# Altium footprint library TarabusLib_KAP.PcbLib: 504 footprints (part 24 of 32)
Each footprint in its own frame and in the unit in brackets; x right, y up, seen from the top. Pads: shape width x height; smd on the part's side, far side on the other; paste and mask are expansions set on the pad; w line width, h text height; cw(c..) or ccw(c..) is an arc to the next point about the centre after c.
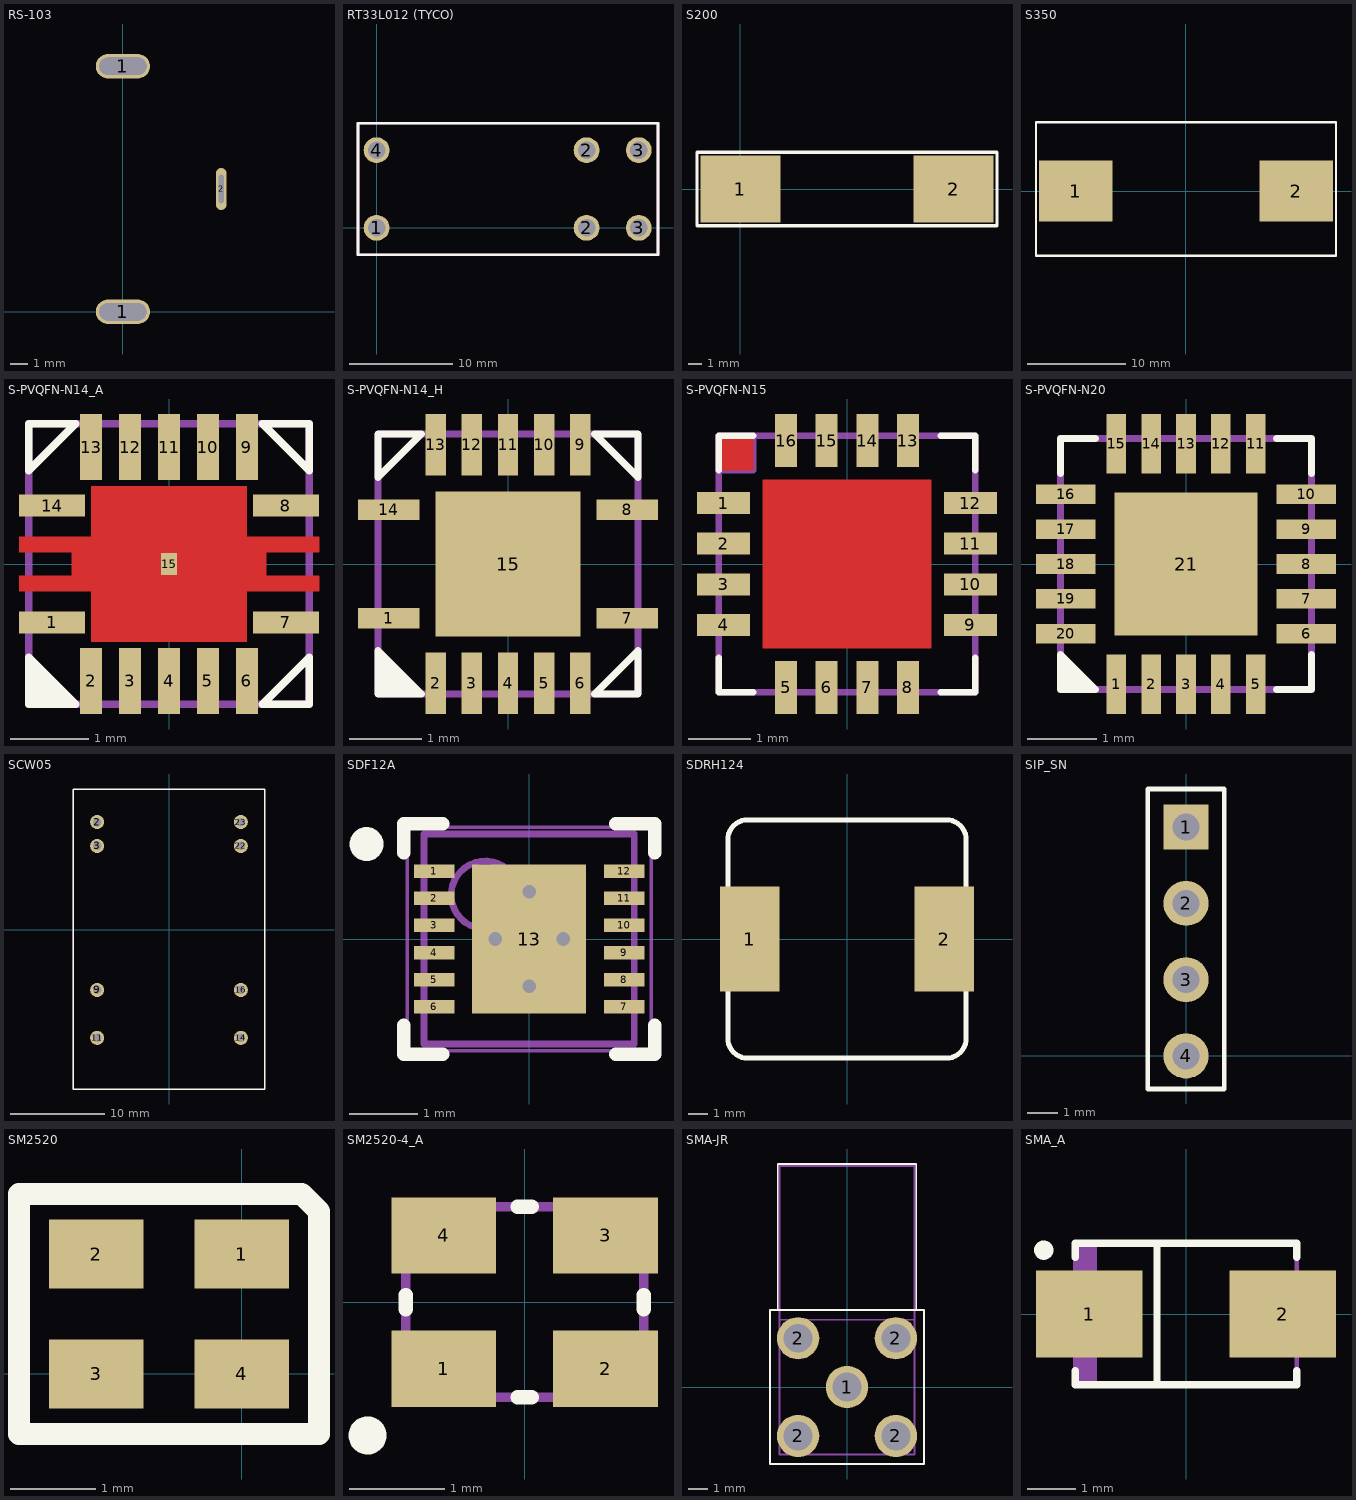
[diagram p23: the footprints below, top view; thin cyan lines are the x and y axes]

## RS-103 [mm]
pads (3):
  oval 3.1x1.4 hole 1 slot 2.7 at 0 deg: 1(0,0) 1(0,14)
  oval 0.6x2.4 hole 0.3 slot 1.6 at 90 deg: 2(5.6,7)
3D body: height 14.4, standoff 0, extent -17.45,-0.35 5.9,14.35

## RT33L012 (TYCO) [mm]
pads (6):
  round 2.5 hole 1.7 mask+0: 1(0,0) 2(20.3,0) 2(20.3,7.5) 3(25.34,0) 3(25.34,7.5) 4(0,7.5)
Top Overlay:
  lines w0.254: -1.8,-2.6 -1.8,10.1 27.2,10.1 27.2,-2.6 -1.8,-2.6
Mechanical 7:
  lines w0.254: -1.8,-2.6 27.2,-2.6 27.2,10.1 -1.8,10.1 -1.8,-2.6
3D body: height 15.7, standoff 0, extent -1.8,-2.6 27.2,10.1

## S200 [mm]
pads (2):
  rect 6x5 smd: 1(0,0) 2(16,0)
Top Overlay:
  lines w0.254: -3.25,-2.75 -3.25,2.75 19.25,2.75 19.25,-2.75 -3.25,-2.75
3D body "S200.STEP": height 0.85, standoff 0.05, extent -2.177,-2.54 17.823,2.46

## S350 [mm]
pads (2):
  rect 7.5x6.2 smd: 1(-11.25,0) 2(11.25,0)
Top Overlay:
  lines w0.254: -15.3,7.05 -15.3,6.7 -15.3,-6.625 15.325,-6.625 15.325,6.85 ; -15.25,7.05 15.025,7.05 15.325,7.05 15.325,6.35
3D body "S350.STEP": height 0.7, standoff -0.1, extent -14.975,-6.375 15.025,6.625

## S-PVQFN-N14_A [mm]
height 1
pads (15):
  rect 0.85x0.28 smd mask+0: 1(-1.5,-0.75) 7(1.5,-0.75) 8(1.5,0.75) 14(-1.5,0.75)
  rect 0.28x0.85 smd mask+0: 2(-1,-1.5) 3(-0.5,-1.5) 4(0,-1.5) 5(0.5,-1.5) 6(1,-1.5) 9(1,1.5) 10(0.5,1.5) 11(0,1.5) 12(-0.5,1.5) 13(-1,1.5)
  rect 0.2x0.28 smd mask+0: 15(0,0)
Top Layer:
  region: 1,-1 1,-0.35 1.925,-0.35 1.925,-0.15 1.25,-0.15 1.25,0.15 1.925,0.15 1.925,0.35 1,0.35 1,1 -1,1 -1,0.35 -1.925,0.35 -1.925,0.15 -1.25,0.15 -1.25,-0.15 -1.925,-0.15 -1.925,-0.35 -1,-0.35 -1,-1
Top Overlay:
  region: -1.8,-1.2 -1.8,-1.8 -1.2,-1.8
  lines w0.1: -1.8,-1.8 -1.2,-1.8 -1.8,-1.2 -1.8,-1.8 ; -1.8,1.2 -1.2,1.8 -1.8,1.8 -1.8,1.2 ; 1.2,-1.8 1.8,-1.2 1.8,-1.8 1.2,-1.8 ; 1.2,1.8 1.8,1.2 1.8,1.8 1.2,1.8
Mechanical 7:
  lines w0.1: -1.8,-1.8 -1.8,1.8 1.8,1.8 1.8,-1.8 -1.8,-1.8
Mechanical 10:
  text ".Comment" at -1.5,-2.4 h0.6
  text ".Designator" at -1.6,2.1 h0.8
3D body: height 1, standoff 0, extent -1.8,-1.8 1.8,1.8

## S-PVQFN-N14_H [mm]
height 1
pads (15):
  rect 0.85x0.28 smd mask+0: 1(-1.65,-0.75) 7(1.65,-0.75) 8(1.65,0.75) 14(-1.65,0.75)
  rect 0.28x0.85 smd mask+0: 2(-1,-1.65) 3(-0.5,-1.65) 4(0,-1.65) 5(0.5,-1.65) 6(1,-1.65) 9(1,1.65) 10(0.5,1.65) 11(0,1.65) 12(-0.5,1.65) 13(-1,1.65)
  rect 2x2 smd mask+0: 15(0,0)
Top Overlay:
  region: -1.8,-1.2 -1.8,-1.8 -1.2,-1.8
  lines w0.1: -1.8,-1.8 -1.2,-1.8 -1.8,-1.2 -1.8,-1.8 ; -1.8,1.2 -1.2,1.8 -1.8,1.8 -1.8,1.2 ; 1.2,-1.8 1.8,-1.2 1.8,-1.8 1.2,-1.8 ; 1.2,1.8 1.8,1.2 1.8,1.8 1.2,1.8
Mechanical 7:
  lines w0.1: -1.8,-1.8 -1.8,1.8 1.8,1.8 1.8,-1.8 -1.8,-1.8
Mechanical 10:
  text ".Comment" at -1.55,-2.875 h0.6
  text ".Designator" at -1.6,2.4 h0.8
3D body: height 1, standoff 0, extent -1.8,-1.8 1.8,1.8

## S-PVQFN-N15 [mm]
pads (16):
  rect 0.85x0.35 smd mask+0: 1(-1.975,0.975) 2(-1.975,0.325) 3(-1.975,-0.325) 4(-1.975,-0.975) 9(1.975,-0.975) 10(1.975,-0.325) 11(1.975,0.325) 12(1.975,0.975)
  rect 0.35x0.85 smd mask+0: 5(-0.975,-1.975) 6(-0.325,-1.975) 7(0.325,-1.975) 8(0.975,-1.975) 13(0.975,1.975) 14(0.325,1.975) 15(-0.325,1.975) 16(-0.975,1.975)
Top Layer:
  region: -1.35,1.35 1.35,1.35 1.35,-1.35 -1.35,-1.35
  region: -2,2 -2,1.5 -1.5,1.5 -1.5,2
Top Overlay:
  lines w0.1: -2.05,-1.5 -2.05,-2.05 -1.5,-2.05 ; -2.05,1.5 -2.05,2.05 -1.5,2.05 ; 1.5,-2.05 2.05,-2.05 2.05,-1.5 ; 1.5,2.05 2.05,2.05 2.05,1.5
Mechanical 7:
  rectangle: -2.05,1.5 -1.5,2.05
  lines w0.1: -2.05,1.5 -1.5,1.5 -1.5,2.05 ; -2.05,-2.05 2.05,-2.05 2.05,2.05 -2.05,2.05 -2.05,-2.05
Mechanical 10:
  text ".Designator" at -0.95,2.7 h0.8
  text ".Comment" at -2.2,-3 h0.6
3D body: height 1, standoff 0, extent -2,-2 2,2

## S-PVQFN-N20 [mm]
pads (21):
  rect 0.28x0.85 smd mask+0: 1(-1,-1.725) 2(-0.5,-1.725) 3(0,-1.725) 4(0.5,-1.725) 5(1,-1.725) 11(1,1.725) 12(0.5,1.725) 13(0,1.725) 14(-0.5,1.725) 15(-1,1.725)
  rect 0.85x0.28 smd mask+0: 6(1.725,-1) 7(1.725,-0.5) 8(1.725,0) 9(1.725,0.5) 10(1.725,1) 16(-1.725,1) 17(-1.725,0.5) 18(-1.725,0) 19(-1.725,-0.5) 20(-1.725,-1)
  rect 2.05x2.05 smd mask+0: 21(0,0)
Top Overlay:
  region: -1.8,-1.3 -1.8,-1.8 -1.3,-1.8
  lines w0.1: -1.8,1.3 -1.8,1.8 -1.3,1.8 ; 1.3,-1.8 1.8,-1.8 1.8,-1.3 ; 1.3,1.8 1.8,1.8 1.8,1.3 ; -1.8,-1.8 -1.8,-1.3 -1.3,-1.8 -1.8,-1.8
Mechanical 7:
  lines w0.1: -1.8,-1.8 1.8,-1.8 1.8,1.8 -1.8,1.8 -1.8,-1.8
3D body: height 1, standoff 0, extent -1.8,-1.8 1.8,1.8

## SCW05 [mm]
height 12.2
pads (8):
  round 1.5 hole 0.9: 2(-7.62,11.44) 3(-7.62,8.9) 9(-7.62,-6.36) 11(-7.62,-11.44) 14(7.62,-11.44) 16(7.62,-6.36) 22(7.62,8.9) 23(7.62,11.44)
Top Overlay:
  lines w0.15: -10.15,-16.86 10.15,-16.86 10.15,14.94 -10.15,14.94 -10.15,-16.86
Mechanical 7:
  lines w0.1: -10.15,-16.86 -10.15,14.94 10.15,14.94 10.15,-16.86 -10.15,-16.86
Mechanical 10:
  text ".Designator" at -1.15,0.45 h0.8
  text ".Comment" at -1.075,-0.675 h0.6
3D body: height 12.2, standoff 0, extent -10.15,-16.86 10.15,14.94

## SDF12A [mm] "SON, 12-Leads, Body 3x3mm, Pitch 0.4mm, NSC Recommended"
height 0.8
pads (13):
  rect 0.6x0.2 smd paste-0.125 mask+0.051: 1(-1.4,1) 2(-1.4,0.6) 3(-1.4,0.2) 4(-1.4,-0.2) 5(-1.4,-0.6) 6(-1.4,-1) 7(1.4,-1) 8(1.4,-0.6) 9(1.4,-0.2) 10(1.4,0.2) 11(1.4,0.6) 12(1.4,1)
  rect 1.68x2.2 smd paste-0.05 mask+0.051: 13(0,0)
via 0,-0.7 diameter 0.5 hole 0.2
via 0,0.7 diameter 0.5 hole 0.2
via 0.5,0 diameter 0.5 hole 0.2
via -0.5,0 diameter 0.5 hole 0.2
Top Overlay:
  circle w0.25: c-2.4,1.4 r0.125
  lines w0.2: -1.85,-1.275 -1.85,-1.7 -1.275,-1.7 ; -1.85,1.275 -1.85,1.7 -1.275,1.7 ; 1.275,-1.7 1.85,-1.7 1.85,-1.275 ; 1.275,1.7 1.85,1.7 1.85,1.275
Top Paste:
  rectangle: -1.9,0.9 -1.2,1.1
  rectangle: -1.9,0.5 -1.2,0.7
  rectangle: -1.9,0.1 -1.2,0.3
  rectangle: -1.9,-0.3 -1.2,-0.1
  rectangle: -1.9,-0.7 -1.2,-0.5
  rectangle: -1.9,-1.1 -1.2,-0.9
  region: 1.9,-0.9 1.2,-0.9 1.2,-1.1 1.9,-1.1
  region: 1.9,-0.5 1.2,-0.5 1.2,-0.7 1.9,-0.7
  region: 1.9,-0.1 1.2,-0.1 1.2,-0.3 1.9,-0.3
  region: 1.9,0.3 1.2,0.3 1.2,0.1 1.9,0.1
  region: 1.9,0.7 1.2,0.7 1.2,0.5 1.9,0.5
  region: 1.9,1.1 1.2,1.1 1.2,0.9 1.9,0.9
Mechanical 13:
  circle w0.1: c-0.65,0.65 r0.5
  lines w0.1: -1.55,-1.55 -1.55,1.55 1.55,1.55 1.55,-1.55 -1.55,-1.55
Mechanical 15:
  lines w0.05: -1.8,-1.65 -1.8,1.65 1.8,1.65 1.8,-1.65 -1.8,-1.65
  lines w0.1: -0.5,0 0.5,0 ; 0,-0.5 0,0.5
3D body: height 0.8, standoff 0, extent -1.55,-1.55 1.55,1.55

## SDRH124 [mm]
pads (2):
  rect 3x5.3 smd: 1(-4.9,0) 2(4.9,0)
Top Overlay:
  lines w0.254: -6,-5 ccw(c-5,-5) -5,-6 5,-6 ccw(c5,-5) 6,-5 6,5 ccw(c5,5) 5,6 -5,6 ccw(c-5,5) -6,5 -6,-5

## SIP_SN [mm]
pads (4):
  rect 1.5x1.5 hole 0.9: 1(0,7.62)
  round 1.5 hole 0.9: 2(0,5.08) 3(0,2.54) 4(0,0)
Top Overlay:
  lines w0.15: -1.27,-1.1 1.27,-1.1 1.27,8.89 -1.27,8.89 -1.27,-1.1
Mechanical 7:
  lines w0.1: -1.27,-1.1 1.27,-1.1 1.27,8.89 -1.27,8.89 -1.27,-1.1
Mechanical 10:
  text ".Comment" at -0.31,9.4 h0.6
  text ".Designator" at -0.42,10.13 h0.8
3D body: height 15, standoff 0, extent -1.27,-1.1 1.27,8.89

## SM2520 [mm]
pads (4):
  rect 1.1x0.8 smd: 1(0,1.4) 2(-1.7,1.4) 3(-1.7,0) 4(0,0)
Top Overlay:
  lines w0.254: -2.6,-0.7 -2.6,2.1 0.7,2.1 0.9,1.9 0.9,-0.7 -2.6,-0.7
3D body: height 1, standoff 0, extent -2.6,-0.7 0.9,2.1

## SM2520-4_A [mm]
height 1
pads (4):
  rect 1.1x0.8 smd: 1(-0.85,-0.7) 2(0.85,-0.7) 3(0.85,0.7) 4(-0.85,0.7)
Top Overlay:
  circle w0.2: c-1.65,-1.4 r0.1
  lines w0.15: -1.25,-0.075 -1.25,0.075 ; -0.075,-1 0.075,-1 ; -0.075,1 0.075,1 ; 1.25,-0.075 1.25,0.075
Mechanical 7:
  lines w0.1: -1.25,-1 -1.25,1 1.25,1 1.25,-1 -1.25,-1
Mechanical 10:
  text ".Designator" at -0.775,1.6 h0.8
  text ".Comment" at -1,-1.725 h0.6
3D body: height 1, standoff 0, extent -1.25,-1 1.25,1

## SMA-JR [mm]
pads (5):
  round 2.2 hole 1.5: 1(0,0) 2(-2.54,-2.54) 2(-2.54,2.54) 2(2.54,-2.54) 2(2.54,2.54)
Top Overlay:
  lines w0.1: -3.6,4 -3.6,11.6 3.6,11.6 3.6,4 ; -4,-4 -4,4 4,4 4,-4 -4,-4
Mechanical 7:
  lines w0.1: -3.5,3.5 -3.5,-3.5 3.5,-3.5 3.5,3.5 ; -3.5,3.5 3.5,3.5 ; -3.5,3.5 -3.5,11.5 3.5,11.5 3.5,3.5
Mechanical 10:
  text ".Designator" at -1.35,5.1 h0.8
  text ".Comment" at -0.875,4.45 h0.6
3D body: height 9.49, standoff 2.51, extent -3.472,3.5 3.5,11.5
3D body: height 10, standoff 0.1, extent -3.5,-3.5 3.5,3.5

## SMA_A [mm]
height 2.67
pads (2):
  rect 2.2x1.8 smd: 1(-2,0) 2(2,0)
Top Overlay:
  circle w0.2: c-2.94,1.32 r0.1
  lines w0.15: -2.29,-1.17 -2.29,-1.46 2.29,-1.46 2.29,-1.17 ; -2.29,1.17 -2.29,1.46 2.29,1.46 2.29,1.17 ; -0.6,-1.45 -0.6,1.45
Mechanical 7:
  lines w0.1: -2.29,-0.82 -2.8,-0.82 -2.8,0.82 -2.29,0.82 ; -2.19,-1.44 -2.19,1.46 ; -2.09,-1.44 -2.09,1.46 ; -1.99,-1.44 -1.99,1.46 ; -1.89,-1.44 -1.89,1.46 ; 2.29,-0.82 2.8,-0.82 2.8,0.82 2.29,0.82 ; -2.29,-1.46 -2.29,1.46 2.29,1.46 2.29,-1.46 -2.29,-1.46
Mechanical 10:
  text ".Comment" at -0.88,-2.11 h0.6
  text ".Designator" at -1.12,1.81 h0.8
3D body "SMA.STEP": height 2.4, standoff 0, extent -2.8,-1.45 2.8,1.45